# Altium integrated library MISKO3.IntLib: 34 symbols
Pins are listed as number, name and electrical type; pins without a type are passive.

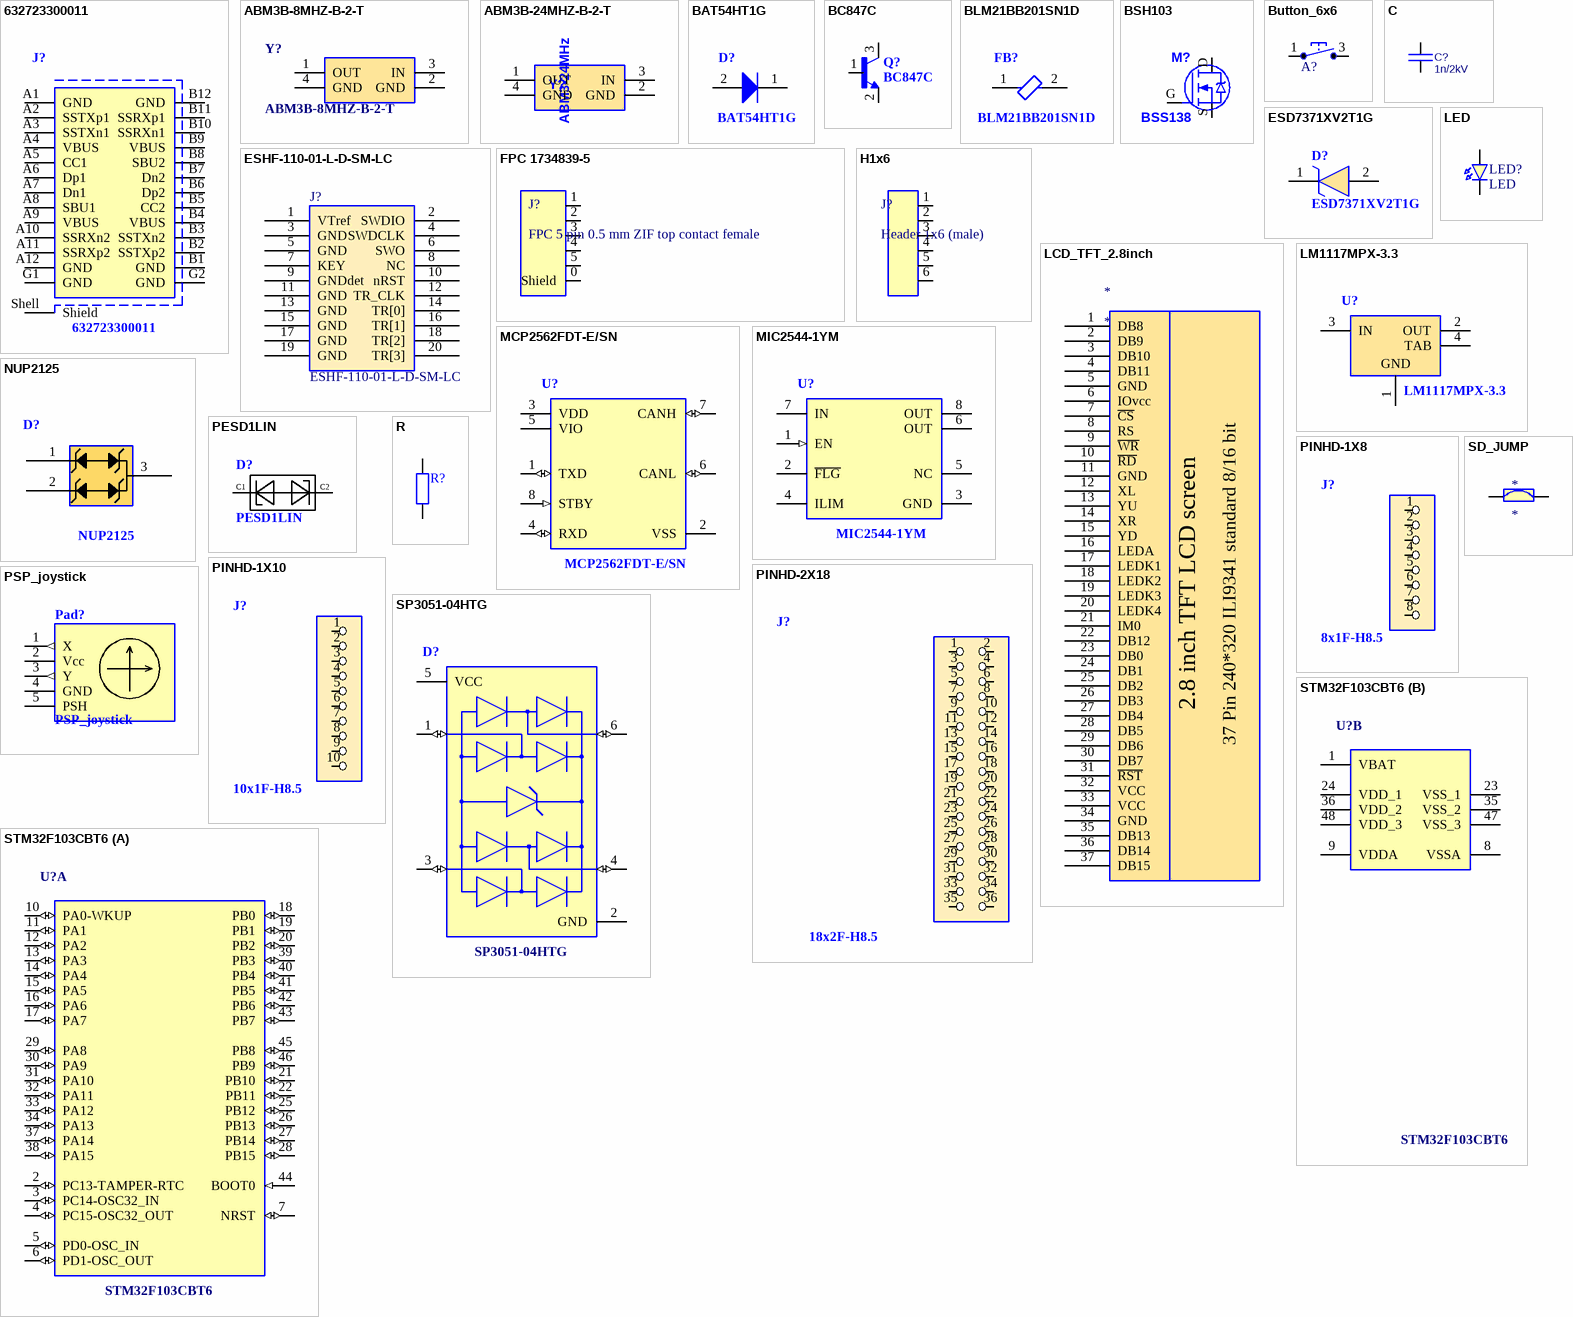
[diagram p0: symbols 632723300011 to STM32F103CBT6]

## 632723300011
designator J?
USB 3.1 Type C Receptacle WR-COM, Horizontal, SMT / THT; Manufacturer: Wurth Elektronik; Manufacturer: Wurth Electronics; Rated Current: 5A; Contact Resistance: 30mOhm; Working Voltage: 20VDC; Code: QBUSB-TYPEC-TM; Operating Temperature: -40to105degC; Package Reference: 632723300011; Datasheet URL: https://katalog.we-online.de/em/datasheet/632723x00011%282%29.pdf; Manufacturer URL: http://www.we-online.de; Connector Type: USB3.1TypeC; Gender: Receptacle; Part Number: 632723300011; Mounting Technology: SMT/THT; Publisher: WurthElektronik; Packaging: TapeandReel; Orientation: Horizontal; Manufacturer Part Number: 632723300011
footprint 632723300011 (USB 3.1 Type C Receptacle Horizontal THR)
pins: A1 GND, A2 SSTXp1, A3 SSTXn1, A4 VBUS, A5 CC1, A6 Dp1, A7 Dn1, A8 SBU1, A9 VBUS, A10 SSRXn2, A11 SSRXp2, A12 GND, B1 GND, B2 SSTXp2, B3 SSTXn2, B4 VBUS, B5 CC2, B6 Dp2, B7 Dn2, B8 SBU2, B9 VBUS, B10 SSRXn1, B11 SSRXp1, B12 GND, G1 GND, G2 GND, Shell Shield

## ABM3B-8MHZ-B-2-T
designator Y?
Crystal or Oscillator / DataSheet: / https://eu.mouser.com/datasheet/2/3/abm3b-1774998.pdf; Manufacturer_Name: ABRACON; Manufacturer_Part_Number: ABM3B-8.000MHZ-B-2-T; Code: KQ8M-3X5; Datasheet Link: https://abracon.com/Resonators/abm3b.pdf; Height: 1.1mm
footprint ABM3B8MHZB2T
pins: 1 OUT, 2 GND, 3 IN, 4 GND

## ABM3B-24MHZ-B-2-T
designator Y?, comment ABM3-24MHz
ABM3-24.000MHZ-2-T,Crystal / DataSheet: / https://eu.mouser.com/datasheet/2/3/abm3-1774854.pdf; Code: KQ24M-3X5
footprint ABM3B24MHZB2T
pins: 1 OUT, 2 GND, 3 IN, 4 GND

## BAT54HT1G
designator D?
Schottky Barrier Diode, 2-Pin SOD-323, Pb-Free, Tape and Reel; Manufacturer: On Semiconductor; Manufacturer: ON Semiconductor / Fairchild; Configuration: Single; trr Max (ns): 5; IFSM Max (A): 0.6; Code: KDBAT54H; ComponentLink3URL: http://www.onsemi.com/pub_link/Collateral/477-02.PDF.1; PackageDescription: 2-Pin SOD, Body 1.7 x 1.25 mm; ComponentLink2URL: http://www.onsemi.cn/pub_link/Collateral/BAT54HT1-D.PDF; ComponentLink3Description: Package Specification; ComponentLink2Description: Datasheet; DatasheetVersion: Rev. 6; PackageReference: SOD-323-2-477-02; RoHS: TRUE; ComponentLink1URL: http://www.onsemi.com/; Packing: Tape and Reel; PartNumber: BAT54HT1G; Mounting Technology: Surface Mount; ComponentLink1Description: Manufacturer URL; PackageVersion: Rev. H, 03/2007; Manufacturer Part Number: BAT54HT1G
footprint ONSC-SOD-323-2-477-02_V (SOD, 2-Leads, Body 1.7x1.25mm)
pins: 1 K, 2 A

## BC847C
designator Q?
Bipolar (BJT) Transistor NPN 45V 100mA 100MHz 250mW Surface Mount TO-236AB; MF: Nexperia USA; Code: KT-NPN-S; MP: BC847C; Package: SOT-23 Nexperia USA; Availability: Unavailable; Price: None; Arrow_Electronics-Purchase-URL: https://snapeda.com/shop?store=Arrow+Electronics&id=590780; SnapEDA_Link: https://www.snapeda.com/parts/BC847C/Nexperia%20USA%20Inc./view-part/590780/?ref=snap; Value: *; KT-NPN-S: *
footprint SOT23-3_L
pins: 1 B, 2 E, 3 C

## BLM21BB201SN1D
designator FB?
Chip Ferrite Bead, 0805, 200Ω @ 100MHz, 0.26Ω, 25%, 500mA; Number of Circuits: 1; Shielding: Unshielded; DC Resistance (DCR): 260mR; Material: Steel; DC Resistance-Max: 350mR; Impedance: 200R; Max DC Current: 200mA; Code: LZ-FB0805; Max Operating Temperature: 125°C; Packaging: Tape and Reel; REACH SVHC: No SVHC; Depth: 1.25mm; Core Material: Ferrite; Case Code (Metric): 2012; Termination: SMD/SMT; Series: BLM21B; Number of Lines: 1; Max Current Rating: 500mA; Package Quantity: 4000; Lead Free: Lead Free; Test Frequency: 100MHz; Case Code (Imperial): 0805; Number of Pins: 2; Height: 0.85mm; Tolerance: 25%; Width: 1.25mm; Case/Package: 0805; Min Operating Temperature: -55°C; Current Rating: 500mA; Length: 2mm
footprint BLM2102FB0805
pins: 1, 2

## BSH103
designator M?, comment BSS138
BSH103-T/R (NMOS); Value: {Value}
footprint SOT23-3_L (Small Outline Transistor (SOT23), 0.96 mm pitch; 3 pin, 2.92 mm L X 1.30 mm W X 1.12 mm H body); pin to pad D>3 G>1 S>2
pins: D, G, S

## Button_6x6
designator A?, comment Tipka_6x6  (value not drawn)
tactile switch SMD; Code: Q-PBUTTON
footprint Tipka 6x6; pin to pad 1>1+2 3>3+4
pins: 1, 3

## C
designator C?, comment 1n/2kV
Capacitor; Code: NH4-1N2KV; Value: 1n/2kV
footprint C1206
footprint C0603 (Chip Capacitor, 2-Leads, Body 1,60x0,81mm, IPC Medium Density)
pins: 1, 2

## ESD7371XV2T1G
designator D?
TVS Diode (Uni-directional); Manufacturer_Name: ON Semiconductor; Code: KD-ESD7371X; Datasheet Link: http://www.onsemi.com/pub/Collateral/ESD7371-D.PDF; Height: 0.7mm; Manufacturer_Part_Number: ESD7371XV2T1G; Mouser Part Number: 863-ESD7371XV2T1G; Mouser Price/Stock: https://www.mouser.co.uk/ProductDetail/ON-Semiconductor/ESD7371XV2T1G?qs=dbuNSGnowt2%2F4vd%2Frk8Hiw%3D%3D; Arrow Part Number: ESD7371XV2T1G; Arrow Price/Stock: https://www.arrow.com/en/products/esd7371xv2t1g/on-semiconductor
footprint SOD1608X70N
pins: 1 K, 2 A

## ESHF-110-01-L-D-SM-LC
designator J?
Code: QYS50-20-M-SMD-LC
footprint ESHF-110-01-L-D-SM-LC
pins: 1 VTref, 2 SWDIO, 3 GND, 4 SWDCLK, 5 GND, 6 SWO, 7 KEY, 8 NC, 9 GNDdet, 10 nRST, 11 GND, 12 TR_CLK, 13 GND, 14 TR[0], 15 GND, 16 TR[1], 17 GND, 18 TR[2], 19 GND, 20 TR[3]

## FPC 1734839-5
designator J?, comment FPC 5 pin 0.5 mm ZIF top contact female
TE connectivity  FPC 5 pin 0.5 mm ZIF top contact female connector 1734839-5; Supplier 1: Digi-Key; Supplier Part Number 1: A101330CT-ND
footprint FPC 1734839-5 (5-pin 0.5mm FPC zif top connector AMP TE)
pins: 0 Shield, 1, 2, 3, 4, 5

## H1x6
designator J?, comment Header 1x6 (male)
footprint H1x6
footprint H1x6_no3D
pins: 1, 2, 3, 4, 5, 6

## LCD_TFT_2.8inch
designator *
footprint LCD_TFT_2.8inch
pins: 1 DB8, 2 DB9, 3 DB10, 4 DB11, 5 GND, 6 IOvcc, 7 ~{CS}, 8 RS, 9 ~{WR}, 10 ~{RD}, 11 GND, 12 XL, 13 YU, 14 XR, 15 YD, 16 LEDA, 17 LEDK1, 18 LEDK2, 19 LEDK3, 20 LEDK4, 21 IM0, 22 DB12, 23 DB0, 24 DB1, 25 DB2, 26 DB3, 27 DB4, 28 DB5, 29 DB6, 30 DB7, 31 ~{RST}, 32 VCC, 33 VCC, 34 GND, 35 DB13, 36 DB14, 37 DB15
text: 2.8 inch TFT LCD screen; 37 Pin 240*320 ILI9341 standard 8/16 bit

## LED
designator LED?
Code: KLB-B
footprint LED0603
footprint LED1206
pins: 1 KATODE, 2 ANODE

## LM1117MPX-3.3
designator U?
800mA Low-Dropout Linear Regulator, 4-pin SOT-223, Pb-Free / DataSheet: / https://www.ti.com/lit/ds/symlink/lm1117.pdf?ts=1629838143263&ref_url=https%253A%252F%252Fwww.google.com%252F; PartNumber: LM1117MPX-3.3/NOPB; Manufacturer: Texas Instruments; High-Reliability: Y; PowerWise: N; PackageTopMarking: XYTT*N05A; CompType: LDO IC; Code: FRL-33-LM1117; ComponentLink1URL: http://www.ti.com/general/docs/lit/getliterature.tsp?genericPartNumber=LM1117-N&fileType=pdf; ComponentLink1Description: Datasheet URL; PinCount: 4; Code_JEDEC: TO-261-AA; PackageDescription: Molded SOT-223, 6.50 x 3.56 x 1.6mm Body, 4 Lead, 2.3mm Pitch; PackageReference: DCY0004A; RoHS: Y; Code_IPC: SOT223-4
footprint DCY0004A_M (SOT223, 4-Leads, Body 6.7x3.7mm, Pitch 2.3mm, IPC Low Density)
pins: 1 GND (power), 2 OUT (power), 3 IN (power), 4 TAB (power)

## MCP2562FDT-E/SN
designator U?
IC TRANSCEIVER 1/1 8SOIC; Operating Supply Current: 70mA; Data Rate: 8Mbps; Number of Transceivers: 1; Receiver Hysteresis: 200mV; Max Supply Voltage: 5.5V; Min Supply Voltage: 4.5V; Code: FC-MCP2562FD; Weight: 0.019048oz; Package Quantity: 3300; Case/Package: SOIC; Mount: Surface Mount; Max Operating Temperature: 125°C; Min Operating Temperature: -40°C; Packaging: Tape and Reel; Number of Pins: 8
footprint FP-C04-057-SN-MFG
pins: 1 TXD (io), 2 VSS (power), 3 VDD (power), 4 RXD (io), 5 VIO (power), 6 CANL (io), 7 CANH (io), 8 STBY (in)

## MIC2544-1YM
designator U?
IC PWR SWITCH N-CHAN 1:1 8MSOP / DataSheet: / https://ww1.microchip.com/downloads/en/DeviceDoc/20005725B.pdf; Manufacturer Part Number: MIC2544-1YMM-TR; Turn-On Delay Time: 5ms; Interface: On/Off; Output Configuration: High Side; Rated Current-Max: 1.5A; Number of Switches: 1; Min Supply Voltage: 2.7V; On-state Resistance-Max: 120MR; Nominal Supply Current: 5uA; Fault Protection: Over Temperature; Turn-Off Delay Time: 22us; Max Supply Voltage: 5.5V; Code: FS-MIC2544; Max Operating Temperature: 85°C; Series: -; Package Quantity: 2500; On-State Resistance: 120mR; Max Output Current: 1.5A; Radiation Hardening: No; Case/Package: MSOP; Min Operating Temperature: -40°C; Number of Outputs: 1; Current Rating: 1.5A; Mount: Surface Mount; Number of Pins: 8; Supply Current: 5uA; Packaging: Tape and Reel; Manufacturer: Microchip
footprint SOIC_8_MIC2544
pins: 1 EN (in), 2 ~{FLG} (oc), 3 GND (power), 4 ILIM, 5 NC, 6 OUT (power), 7 IN (power), 8 OUT (power)

## NUP2125
designator D?
SOT23127P600-8N / Dual Line Automotive Bus protection / Datasheet: https://www.onsemi.com/pdf/datasheet/nup2125-d.pdf; Code: KD-NUP2125
footprint SOT23127P600-8N
pins: 1 CANL, 2 CANH, 3 GND

## PESD1LIN
designator D?
LIN-bus ESD protection diode; Code: KD-PESD1LIN
footprint PESD1LIN_footprint (SODFL, 2-Leads)
pins: 1 C1, 2 C2

## PINHD-1X8
designator J?, comment 8x1F-H8.5
PINHD-1X8
footprint 1X08 (PIN HEADER)
pins: 1, 2, 3, 4, 5, 6, 7, 8

## PINHD-1X10
designator J?, comment 10x1F-H8.5
PINHD-1X10
footprint 1X10 (PIN HEADER)
pins: 1, 2, 3, 4, 5, 6, 7, 8, 9, 10

## PINHD-2X18
designator J?, comment 18x2F-H8.5
PINHD-2X18
footprint 2X18 (PIN HEADER)
pins: 1, 2, 3, 4, 5, 6, 7, 8, 9, 10, 11, 12, 13, 14, 15, 16, 17, 18, 19, 20, 21, 22, 23, 24, 25, 26, 27, 28, 29, 30, 31, 32, 33, 34, 35, 36

## PSP_joystick
designator Pad?
footprint PSP_joystick
pins: 1 X (out), 2 Vcc (power), 3 Y (out), 4 GND (power), 5 PSH (power)

## R
designator R?  (value not drawn)
Resistor; Code: LC5-10K
footprint R1608_0603I_L (Chip Resistor, 2-Leads, Body 1.57x0.85mm, IPC High Density)
pins: 1, 2

## SD_JUMP
designator *
footprint SOLDER_JUMPER
pins: 1 37, 2 38

## SP3051-04HTG
designator D?
TVS DIODE 6V 17V SOT23-6; Manufacturer: Littelfuse; Peak Pulse Current: 20A; Capacitance: 1.7pF; Number Of Channels: 4; Value: 1.7pF; Breakdown Voltage: 8V; Standoff Height: 0mm; Direction: Unidirectional; Peak Pulse Power: 400W; Clamping Voltage: 14.3V; Code: KDSP3051; RoHS: TRUE; Temperature Range High: +125°C; Manufacturer Part Number: SP3051-04HTG; Automotive: No; Device Class L2: TVS Diodes; Reverse Standoff Voltage: 6V; ComponentLink2URL: https://www.littelfuse.com/~/media/electronics/datasheets/tvs_diode_arrays/littelfuse_tvs_diode_array_sp3051_datasheet.pdf.pdf; Mouser Description: TVS Diodes / ESD Suppressors 6V 20A for Lightning Surge PRO SOT23-6; Lead Free: Yes; Ipc Land Pattern Name: SOT95P280X118-6; Octopart: https://octopart.com/sp3051-04htg-littelfuse-29505621; Digikey Description: TVS DIODE 6V 17V SOT23-6; Device Class L3: unset; Temperature Range Low: -40°C; Height: 1.45mm; Temperature: -40°C to +125°C; Category: Diode; Package: SP3051; ComponentLink2Description: Datasheet; Device Class L1: Circuit Protection
footprint FP-SP3051-IPC_C
pins: 1 I/O 1 (io), 2 GND (power), 3 I/O 2 (io), 4 I/O 3 (io), 5 VCC (power), 6 I/O 4 (io)

## STM32F103CBT6
designator U?
ARM Cortex-M3 32-bit MCU, 128 KB Flash, 20 KB Internal RAM, 37 I/Os, 48-pin LQFP, -40 to 85 degC, Tray / DataSheet: / https://www.st.com/resource/en/datasheet/stm32f103c8.pdf / About STLINK: / https://www.st.com/resource/en/user_manual/dm00231744-stm32-nucleo-32-boards-mb1180-stmicroelectronics.pdf; Supply Voltage(Vcc) min (V): 2; Operating Frequency(F) (Processor speed) (MHz): 72; A/D Converter: 2x12-bit (10 Channel); FLASH Size (Prog) (kB): 128; Internal RAM Size (kB): 20; I/Os (High Current): 37; ComponentLink2Description: Datasheet; PackageReference: LQFP48; PartNumber: STM32F103CBT6; ComponentLink1Description: Manufacturer URL; DatasheetVersion: Rev. 16; PackageVersion: Rev. 6, 06/2013; Packing: Tray; ComponentLink1URL: http://www.st.com/web/en/home.html; Mounting Technology: Surface Mount; ComponentLink3URL: http://www.st.com/st-web-ui/static/active/en/resource/technical/document/datasheet/DM00058181.pdf; PackageDescription: 48-Pin Low Profile Quad Flat Package, 7 x 7 mm Body, 0.5 mm Pitch; Core: ARM Cortex-M3; ComponentLink3Description: Package Specification; ComponentLink2URL: http://www.st.com/st-web-ui/static/active/en/resource/technical/document/datasheet/CD00161566.pdf; Manufacturer: STMicroelectronics; Manufacturer Part Number: STM32F103CBT6
footprint STM-LQFP48_L (QFP, 48-Leads, Body 7x7mm, Pitch 0.5mm, IPC High Density)
part A pins: 2 PC13-TAMPER-RTC (io) "PC13-TAMPER-RTC/PC13/TAMPER-RTC", 3 PC14-OSC32_IN (io) "PC14-OSC32_IN/PC14/OSC32_IN", 4 PC15-OSC32_OUT (io) "PC15-OSC32_OUT/PC15/OSC32_OUT", 5 PD0-OSC_IN (io) "PD0/OSC_IN", 6 PD1-OSC_OUT (io) "PD1/OSC_OUT", 7 NRST (io), 10 PA0-WKUP (io) "PA0-WKUP/PA0/WKUP/USART2_CTS/ADC12_IN0/TIM2_CH1_ETR", 11 PA1 (io) "PA1/USART2_RTS/ADC12_IN1/TIM2_CH2", 12 PA2 (io) "PA2/USART2_TX/ADC12_IN2/TIM2_CH3", 13 PA3 (io) "PA3/USART2_RX/ADC12_IN3/TIM2_CH4", 14 PA4 (io) "PA4/SPI1_NSS/USART2_CK/ADC12_IN4", 15 PA5 (io) "PA5/SPI1_SCK/ADC12_IN5", 16 PA6 (io) "PA6/SPI1_MISO/ADC12_IN6/TIM3_CH1/TIM1_BKIN", 17 PA7 (io) "PA7/SPI1_MOSI/ADC12_IN7/TIM3_CH2/TIM1_CH1N", 18 PB0 (io) "PB0/ADC12_IN8/TIM3_CH3/TIM1_CH2N", 19 PB1 (io) "PB1/ADC12_IN9/TIM3_CH4/TIM1_CH3N", 20 PB2 (io) "PB2/BOOT1", 21 PB10 (io) "PB10/I2C2_SCL/USART3_TX/TIM2_CH3", 22 PB11 (io) "PB11/I2C2_SDA/USART3_RX/TIM2_CH4", 25 PB12 (io) "PB12/SPI2_NSS/I2C2_SMBAl/USART3_CK/TIM1_BKIN", 26 PB13 (io) "PB13/SPI2_SCK/USART3_CTS/TIM1_CH1N", 27 PB14 (io) "PB14/SPI2_MISO/USART3_RTS/TIM1_CH2N", 28 PB15 (io) "PB15/SPI2_MOSI/TIM1_CH3N", 29 PA8 (io) "PA8/USART1_CK/TIM1_CH1/MCO", 30 PA9 (io) "PA9/USART1_TX/TIM1_CH2", 31 PA10 (io) "PA10/USART1_RX/TIM1_CH3", 32 PA11 (io) "PA11/USART1_CTS/CANRX/USBDM/TIM1_CH4", 33 PA12 (io) "PA12/USART1_RTS/CANTX/USBDP/TIM1_ETR", 34 PA13 (io) "PA13/JTMS/SWDIO", 37 PA14 (io) "PA14/JTCK/SWCLK", 38 PA15 (io) "PA15/JTDI/TIM2_CH1_ETR/SPI1_NSS", 39 PB3 (io) "PB3/JTDO/TIM2_CH2/TRACESWO/SPI1_SCK", 40 PB4 (io) "PB4/NJTRST/TIM3_CH1/SPI1_MISO", 41 PB5 (io) "PB5/I2C1_SMBAI/TIM3_CH2/SPI1_MOSI", 42 PB6 (io) "PB6/I2C1_SCL/TIM4_CH1/USART1_TX", 43 PB7 (io) "PB7/I2C1_SDA/TIM4_CH2/USART1_RX", 44 BOOT0 (in), 45 PB8 (io) "PB8/TIM4_CH3/I2C1_SCL/CANRX", 46 PB9 (io) "PB9/TIM4_CH4/I2C1_SDA/CANTX"
part B pins: 1 VBAT (power), 8 VSSA (power), 9 VDDA (power), 23 VSS_1 (power), 24 VDD_1 (power), 35 VSS_2 (power), 36 VDD_2 (power), 47 VSS_3 (power), 48 VDD_3 (power)

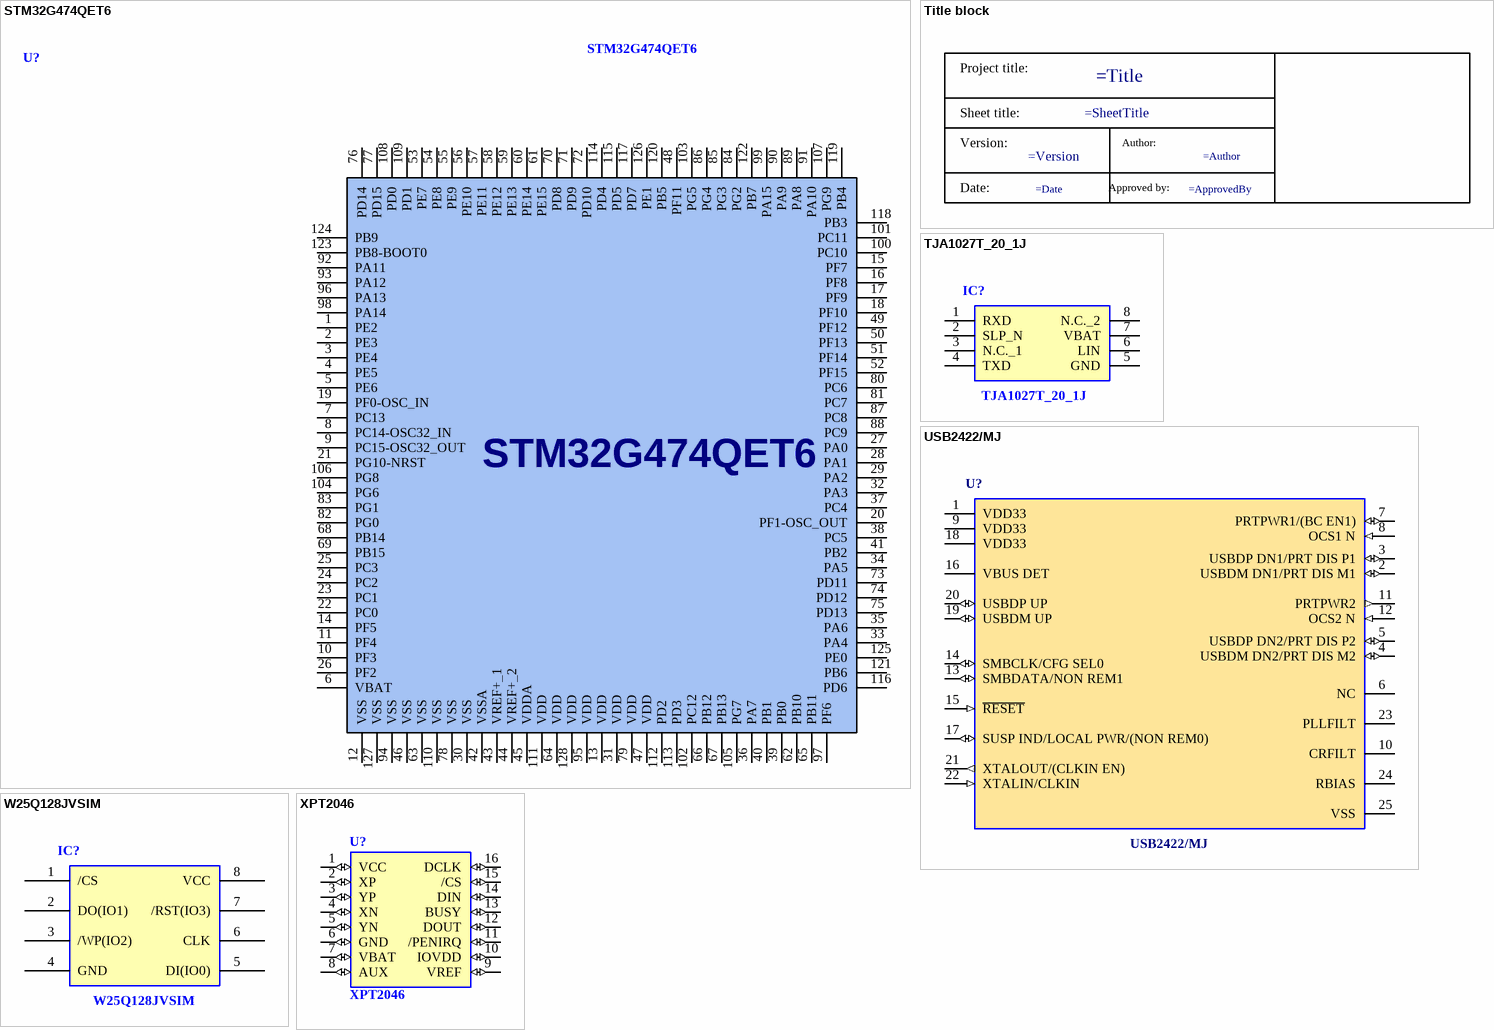
[diagram p1: symbols STM32G474QET6 to XPT2046]

## STM32G474QET6
designator U?
Mainstream Arm Cortex - M3 MCU 170Mhz with 512 Kbytes of Flash memory, Math Accelerator, HR timer, High Analog level integration / DataSheet: / https://www.st.com/en/microcontrollers-microprocessors/stm32g474qe.html; Manufacturer_Name: STMicroelectronics; Datasheet Link: https://componentsearchengine.com/Datasheets/1/STM32G474QET6.pdf; Height: 1.6mm; Manufacturer_Part_Number: STM32G474QET6; Mouser Part Number: 511-STM32G474QET6; Mouser Price/Stock: https://www.mouser.co.uk/ProductDetail/STMicroelectronics/STM32G474QET6?qs=PzGy0jfpSMtk6tieSqAtNg%3D%3D; Arrow Part Number: STM32G474QET6; Arrow Price/Stock: https://www.arrow.com/en/products/stm32g474qet6/stmicroelectronics?region=nac
footprint QFP40P1600X1600X160-128N
pins: 1 PE2, 2 PE3, 3 PE4, 4 PE5, 5 PE6, 6 VBAT, 7 PC13, 8 PC14-OSC32_IN, 9 PC15-OSC32_OUT, 10 PF3, 11 PF4, 12 VSS, 13 VDD, 14 PF5, 15 PF7, 16 PF8, 17 PF9, 18 PF10, 19 PF0-OSC_IN, 20 PF1-OSC_OUT, 21 PG10-NRST, 22 PC0, 23 PC1, 24 PC2, 25 PC3, 26 PF2, 27 PA0, 28 PA1, 29 PA2, 30 VSS, 31 VDD, 32 PA3, 33 PA4, 34 PA5, 35 PA6, 36 PA7, 37 PC4, 38 PC5, 39 PB0, 40 PB1, 41 PB2, 42 VSSA, 43 VREF+_1, 44 VREF+_2, 45 VDDA, 46 VSS, 47 VDD, 48 PF11, 49 PF12, 50 PF13, 51 PF14, 52 PF15, 53 PE7, 54 PE8, 55 PE9, 56 PE10, 57 PE11, 58 PE12, 59 PE13, 60 PE14, 61 PE15, 62 PB10, 63 VSS, 64 VDD, 65 PB11, 66 PB12, 67 PB13, 68 PB14, 69 PB15, 70 PD8, 71 PD9, 72 PD10, 73 PD11, 74 PD12, 75 PD13, 76 PD14, 77 PD15, 78 VSS, 79 VDD, 80 PC6, 81 PC7, 82 PG0, 83 PG1, 84 PG2, 85 PG3, 86 PG4, 87 PC8, 88 PC9, 89 PA8, 90 PA9, 91 PA10, 92 PA11, 93 PA12, 94 VSS, 95 VDD, 96 PA13, 97 PF6, 98 PA14, 99 PA15, 100 PC10, 101 PC11, 102 PC12, 103 PG5, 104 PG6, 105 PG7, 106 PG8, 107 PG9, 108 PD0, 109 PD1, 110 VSS, 111 VDD, 112 PD2, 113 PD3, 114 PD4, 115 PD5, 116 PD6, 117 PD7, 118 PB3, 119 PB4, 120 PB5, 121 PB6, 122 PB7, 123 PB8-BOOT0, 124 PB9, 125 PE0, 126 PE1, 127 VSS, 128 VDD

## Title block
designator T?  (value not drawn)
text: Project title:; Sheet title:; Version:; Author:; Date:; Approved by:

## TJA1027T_20_1J
designator IC?
Integrated Circuit, LIN Transciever / DataSheet: / https://www.nxp.com/docs/en/data-sheet/TJA1027.pdf; Manufacturer_Name: NXP; Manufacturer_Part_Number: TJA1027T/20/1J; Code: FC-TJA1027; Datasheet Link: http://www.nxp.com/docs/en/data-sheet/TJA1027.pdf; Height: 1.75mm; Mouser Part Number: 771-TJA1027T/20/1J; Mouser Price/Stock: https://www.mouser.co.uk/ProductDetail/NXP-Semiconductors/TJA1027T-20-1J?qs=8qdoF%2F2f1vr94fCG5MNBhg%3D%3D; Arrow Part Number: TJA1027T/20/1J; Arrow Price/Stock: https://www.arrow.com/en/products/tja1027t201j/nxp-semiconductors
footprint SOIC127P600X175-8N
pins: 1 RXD, 2 SLP_N, 3 N.C._1, 4 TXD, 5 GND, 6 LIN, 7 VBAT, 8 N.C._2

## USB2422/MJ
designator U?
IC HUB CTLR USB 2.0 24QFN / DataSheet: / http://ww1.microchip.com/downloads/en/devicedoc/00001726b.pdf; Operating Supply Voltage: 3.3V; Data Rate: 480Mbps; Number of Ports: 2; Interface: I2C; Operating Supply Current: 70mA; Case/Package: QFN; Packaging: Bulk; Package Quantity: 490; Lead Free: Lead Free; Min Operating Temperature: 0°C; Number of Pins: 24; RoHS Compliant: Yes; Max Operating Temperature: 70°C; Code: *
footprint FP-24-S4QFN-4x4B-0_5P-IPC_C
pins: 1 VDD33 (power), 2 USBDM DN1/PRT DIS M1 (io), 3 USBDP DN1/PRT DIS P1 (io), 4 USBDM DN2/PRT DIS M2 (io), 5 USBDP DN2/PRT DIS P2 (io), 6 NC, 7 PRTPWR1/(BC EN1) (io), 8 OCS1 N (in), 9 VDD33 (power), 10 CRFILT, 11 PRTPWR2 (out), 12 OCS2 N (in), 13 SMBDATA/NON REM1 (io), 14 SMBCLK/CFG SEL0 (io), 15 ~{RESET} (in), 16 VBUS DET (power), 17 SUSP IND/LOCAL PWR/(NON REM0) (io), 18 VDD33 (power), 19 USBDM UP (io), 20 USBDP UP (io), 21 XTALOUT/(CLKIN EN) (out), 22 XTALIN/CLKIN (in), 23 PLLFILT, 24 RBIAS, 25 VSS (power)

## W25Q128JVSIM
designator IC?
FLASH - NOR Memory IC 128Mb (16M x 8) SPI - Quad I/O, QPI, DTR 133MHz 8-SOIC
footprint W25Q128JVSIM
pins: 1 /CS, 2 DO(IO1), 3 /WP(IO2), 4 GND, 5 DI(IO0), 6 CLK, 7 /RST(IO3), 8 VCC

## XPT2046
designator U?
RASPBERRY PI 3.5 TFT DISPLAY; MF: Xptek; Value: *; Package: Package; Availability: Unavailable; SnapEDA_Link: https://www.snapeda.com/parts/XPT2046/Xptek/view-part/5164510/?ref=snap; MP: XPT2046; Price: None; Check_prices: https://www.snapeda.com/parts/XPT2046/Xptek/view-part/5164510/?ref=eda
footprint TSSOP16
pins: 1 VCC (io), 2 XP (io), 3 YP (io), 4 XN (io), 5 YN (io), 6 GND (io), 7 VBAT (io), 8 AUX (io), 9 VREF (io), 10 IOVDD (io), 11 /PENIRQ (io), 12 DOUT (io), 13 BUSY (io), 14 DIN (io), 15 /CS (io), 16 DCLK (io)